# Altium schematic symbol library BARKO_SCHLIB.SchLib: 1064 symbols (part 9 of 11) (continued)
## R-0R-0402 3 Pad (continued)
RES SMD 0 OHM JUMPER 1/16W 0402; Manufacturer: Royal Electronic Factory; Manufacturer Part Number: 0402WGJ0000TCE; Resistance: 0mR; Max Power Dissipation: 63mW; Power Rating: 62.5mW; Tolerance: 5%; Voltage Rating: 50V; Temperature Coefficient: 200ppm/°C; .PCBCHK: USED; .Creator: F:TALI; Washability: OK; ComponentLink1URL: http://www.vishay.com/docs/20035/dcrcwe3.pdf; ComponentLink1Description: http://www.vishay.com/docs/20035/dcrcwe3.pdf; ComponentLink2URL: http://www.farnell.com/datasheets/2111203.pdf; ComponentLink2Description: http://www.farnell.com/datasheets/2111203.pdf; ComponentLink3URL: http://www.farnell.com/datasheets/2045673.pdf; ComponentLink3Description: http://www.farnell.com/datasheets/2045673.pdf; ComponentLink4URL: https://www.distrelec.biz/Web/Downloads/a_/en/flD-CRCW-e3_data_en.pdf?mime=application%2Fpdf; ComponentLink4Description: https://www.distrelec.biz/Web/Downloads/a_/en/flD-CRCW-e3_data_en.pdf?mime=application%2Fpdf; ComponentLink5URL: http://datasheet.octopart.com/CRCW04020000Z0ED-Vishay-datasheet-14722531.pdf; ComponentLink5Description: http://datasheet.octopart.com/CRCW04020000Z0ED-Vishay-datasheet-14722531.pdf; ComponentLink6URL: http://datasheet.octopart.com/CRCW04020000Z0ED-Vishay-datasheet-83961561.pdf; ComponentLink6Description: http://datasheet.octopart.com/CRCW04020000Z0ED-Vishay-datasheet-83961561.pdf; ComponentLink7URL: http://datasheet.octopart.com/CRCW04020000Z0ED-Vishay-datasheet-16179825.pdf; ComponentLink7Description: http://datasheet.octopart.com/CRCW04020000Z0ED-Vishay-datasheet-16179825.pdf; ComponentLink8URL: http://datasheet.octopart.com/CRCW04020000Z0ED-Vishay-datasheet-62317933.pdf; ComponentLink8Description: http://datasheet.octopart.com/CRCW04020000Z0ED-Vishay-datasheet-62317933.pdf; ComponentLink9URL: http://datasheet.octopart.com/CRCW04020000Z0ED-Vishay-datasheet-5300368.pdf; ComponentLink9Description: http://datasheet.octopart.com/CRCW04020000Z0ED-Vishay-datasheet-5300368.pdf; ComponentLink10URL: http://datasheet.octopart.com/CRCW04020000Z0ED-Vishay-datasheet-5306405.pdf; ComponentLink10Description: http://datasheet.octopart.com/CRCW04020000Z0ED-Vishay-datasheet-5306405.pdf; ComponentLink11URL: http://datasheet.octopart.com/CRCW04020000Z0ED-Vishay-datasheet-11516975.pdf; ComponentLink11Description: http://datasheet.octopart.com/CRCW04020000Z0ED-Vishay-datasheet-11516975.pdf; ComponentLink12URL: http://datasheet.octopart.com/CRCW04020000Z0ED-Vishay-datasheet-17599201.pdf; ComponentLink12Description: http://datasheet.octopart.com/CRCW04020000Z0ED-Vishay-datasheet-17599201.pdf; ComponentLink13URL: http://datasheet.octopart.com/CRCW04020000Z0ED-Vishay-datasheet-41302739.pdf; ComponentLink13Description: http://datasheet.octopart.com/CRCW04020000Z0ED-Vishay-datasheet-41302739.pdf; ComponentLink14URL: http://datasheet.octopart.com/CRCW04020000Z0ED-Vishay-datasheet-27121962.pdf; ComponentLink14Description: http://datasheet.octopart.com/CRCW04020000Z0ED-Vishay-datasheet-27121962.pdf; ComponentLink15URL: http://datasheet.octopart.com/CRCW04020000Z0ED-Vishay-datasheet-66077789.pdf; ComponentLink15Description: http://datasheet.octopart.com/CRCW04020000Z0ED-Vishay-datasheet-66077789.pdf; ComponentLink16URL: http://datasheet.octopart.com/CRCW04020000Z0ED-Vishay-datasheet-42367.pdf; ComponentLink16Description: http://datasheet.octopart.com/CRCW04020000Z0ED-Vishay-datasheet-42367.pdf; ComponentLink17URL: http://datasheet.octopart.com/CRCW04020000Z0ED-Vishay-datasheet-148188.pdf; ComponentLink17Description: http://datasheet.octopart.com/CRCW04020000Z0ED-Vishay-datasheet-148188.pdf; ComponentLink18URL: http://datasheet.octopart.com/CRCW04020000Z0ED-Vishay-datasheet-5377255.pdf; ComponentLink18Description: http://datasheet.octopart.com/CRCW04020000Z0ED-Vishay-datasheet-5377255.pdf; ComponentLink19URL: http://datasheet.octopart.com/CRCW04020000Z0ED-Vishay-datasheet-8619608.pdf; ComponentLink19Description: http://datasheet.octopart.com/CRCW04020000Z0ED-Vishay-datasheet-8619608.pdf; ComponentLink20URL: http://datasheet.octopart.com/CRCW04020000Z0ED-Vishay-datasheet-11540273.pdf; ComponentLink20Description: http://datasheet.octopart.com/CRCW04020000Z0ED-Vishay-datasheet-11540273.pdf; ComponentLink21URL: http://datasheet.octopart.com/CRCW04020000Z0ED-Vishay-datasheet-12001583.pdf; ComponentLink21Description: http://datasheet.octopart.com/CRCW04020000Z0ED-Vishay-datasheet-12001583.pdf; ComponentLink22URL: http://datasheet.octopart.com/CRCW04020000Z0ED-Vishay-datasheet-546287.pdf; ComponentLink22Description: http://datasheet.octopart.com/CRCW04020000Z0ED-Vishay-datasheet-546287.pdf; ComponentLink23URL: http://datasheet.octopart.com/CRCW04020000Z0ED-Vishay-datasheet-8361388.pdf; ComponentLink23Description: http://datasheet.octopart.com/CRCW04020000Z0ED-Vishay-datasheet-8361388.pdf; ComponentLink24URL: http://datasheet.octopart.com/CRCW04020000Z0ED-Vishay-datasheet-8788789.pdf; ComponentLink24Description: http://datasheet.octopart.com/CRCW04020000Z0ED-Vishay-datasheet-8788789.pdf; ComponentLink25URL: http://datasheet.octopart.com/CRCW04020000Z0ED-Vishay-datasheet-10322335.pdf; ComponentLink25Description: http://datasheet.octopart.com/CRCW04020000Z0ED-Vishay-datasheet-10322335.pdf; ComponentLink26URL: http://datasheet.octopart.com/CRCW04020000Z0ED-Vishay-datasheet-12509762.pdf; ComponentLink26Description: http://datasheet.octopart.com/CRCW04020000Z0ED-Vishay-datasheet-12509762.pdf; ComponentLink27URL: http://datasheet.octopart.com/CRCW04020000Z0ED-Vishay-datasheet-12517896.pdf; ComponentLink27Description: http://datasheet.octopart.com/CRCW04020000Z0ED-Vishay-datasheet-12517896.pdf; ComponentLink28URL: http://datasheet.octopart.com/CRCW04020000Z0ED-Vishay-datasheet-12532161.pdf; ComponentLink28Description: http://datasheet.octopart.com/CRCW04020000Z0ED-Vishay-datasheet-12532161.pdf; ComponentLink29URL: http://datasheet.octopart.com/CRCW04020000Z0ED-Vishay-datasheet-12600034.pdf; ComponentLink29Description: http://datasheet.octopart.com/CRCW04020000Z0ED-Vishay-datasheet-12600034.pdf; ComponentLink30URL: http://datasheet.octopart.com/CRCW04020000Z0ED-Vishay-datasheet-13034211.pdf; ComponentLink30Description: http://datasheet.octopart.com/CRCW04020000Z0ED-Vishay-datasheet-13034211.pdf; ComponentLink31URL: http://datasheet.octopart.com/CRCW04020000Z0ED-Vishay-datasheet-13195083.pdf; ComponentLink31Description: http://datasheet.octopart.com/CRCW04020000Z0ED-Vishay-datasheet-13195083.pdf; ComponentLink32URL: http://datasheet.octopart.com/CRCW04020000Z0ED-Vishay-datasheet-13242068.pdf; ComponentLink32Description: http://datasheet.octopart.com/CRCW04020000Z0ED-Vishay-datasheet-13242068.pdf; ComponentLink33URL: http://datasheet.octopart.com/CRCW04020000Z0ED-Vishay-datasheet-14190200.pdf; ComponentLink33Description: http://datasheet.octopart.com/CRCW04020000Z0ED-Vishay-datasheet-14190200.pdf; ComponentLink34URL: http://datasheet.octopart.com/CRCW04020000Z0ED-Vishay-Dale-datasheet-38056517.pdf; ComponentLink34Description: http://datasheet.octopart.com/CRCW04020000Z0ED-Vishay-Dale-datasheet-38056517.pdf; ComponentLink35URL: http://datasheet.octopart.com/CRCW04020000Z0ED-Vishay-Dale-datasheet-47688880.pdf; ComponentLink35Description: http://datasheet.octopart.com/CRCW04020000Z0ED-Vishay-Dale-datasheet-47688880.pdf; ComponentLink36URL: http://datasheet.octopart.com/D-CRCW-e3-Standard-Thick-Film-Chip-Resistors-Vishay-datasheet-family-64.pdf; ComponentLink36Description: http://datasheet.octopart.com/D-CRCW-e3-Standard-Thick-Film-Chip-Resistors-Vishay-datasheet-family-64.pdf; Stock 1: 3532500; Pricing 1: 100=0.0089, 1000=0.0025, 10000=0.0013, 50000=0.00115, 250000=0.00105 (USD); Stock 2: 29923308; Pricing 2: 1=0.1, 10=0.014, 25=0.01, 50=0.0078, 100=0.0057, 250=0.00436, 500=0.00348, 1000=0.00257, 5000=0.00184 (USD); Case/Package: 0402; Case Code (Metric): 1005; Contact Plating: Matte,Tin; Min Operating Temperature: -55°C; Max Operating Temperature: 155°C; Packaging: Tape and Reel; Composition: Thick Film; Package Quantity: 1; Number of Terminations: 2; Termination: SMD/SMT; Features: Moisture Resistant; Military Standard: Not; Length: 1mm; Height: 0.016inch; Width: 0.02inch; Depth: 0.5mm; Radiation Hardening: No; Lead Free: Lead Free; REACH SVHC: Unknown; ComponentLink37URL: http://www.yageo.com/documents/recent/PYu-RC_Group_51_RoHS_L_9.pdf; ComponentLink37Description: http://www.yageo.com/documents/recent/PYu-RC_Group_51_RoHS_L_9.pdf; ComponentLink38URL: http://www.yageo.com/documents/recent/PYu-RC0402_51_RoHS_L_6.pdf; ComponentLink38Description: http://www.yageo.com/documents/recent/PYu-RC0402_51_RoHS_L_6.pdf; ComponentLink39URL: http://www.farnell.com/datasheets/1018594.pdf; ComponentLink39Description: http://www.farnell.com/datasheets/1018594.pdf; ComponentLink40URL: https://www.verical.com/server-webapp/html/getDatasheet?partID=326379; ComponentLink40Description: https://www.verical.com/server-webapp/html/getDatasheet?partID=326379; ComponentLink41URL: http://www.farnell.com/datasheets/2167052.pdf; ComponentLink41Description: http://www.farnell.com/datasheets/2167052.pdf; Mount: Surface Mount; Weight: 2.3E-05oz; Voltage Rating (DC): 50V; Stock 3: 70631880; Pricing 3: 1=0.1, 10=0.03, 25=0.0216, 50=0.0164, 100=0.0121, 250=0.00924, 500=0.0074, 1000=0.00545, 5000=0.00391 (USD); ComponentLink42URL: http://industrial.panasonic.com/www-data/pdf/AOA0000/AOA0000CE1.pdf; ComponentLink42Description: http://industrial.panasonic.com/www-data/pdf/AOA0000/AOA0000CE1.pdf; ComponentLink43URL: http://www.alliedelec.com/m/d/51cd0790071e1666bdb9d00c57fcf960.pdf; ComponentLink43Description: http://www.alliedelec.com/m/d/51cd0790071e1666bdb9d00c57fcf960.pdf; ComponentLink44URL: http://www.farnell.com/datasheets/2059623.pdf; ComponentLink44Description: http://www.farnell.com/datasheets/2059623.pdf; ComponentLink45URL: http://www.farnell.com/datasheets/1678796.pdf; ComponentLink45Description: http://www.farnell.com/datasheets/1678796.pdf; .SCHCHK: USED; Supplier 1: Digi-Key; Supplier Part Number 1: 311-0.0JRDKR-ND
footprint R-0402 - 3 Pad
pins: 1, 2, 3

## R-0R-0603
designator R?, comment 0R  Case Code (Imperial): 0603
RES SMD 0 OHM 1/10W JUMP 0603; Manufacturer: Yageo; Manufacturer Part Number: RC0603JR-070RL; Resistance: 0mR; Tolerance: 1%; Power Rating: 100mW; Voltage Rating (DC): 50V; Temperature Coefficient: 200ppm/°C; Current Rating: 1A; Working Voltage: 75V; .PCBCHK: USED; .Creator: F:TALI; Washability: OK; Stock 1: 54397731; Pricing 1: 1=0.1, 10=0.021, 25=0.0152, 50=0.0114, 100=0.0084, 250=0.00644, 500=0.00514, 1000=0.00379 (USD); Case/Package: 0603; Number of Pins: 2; Contact Plating: Matte,Tin; Case Code (Metric): 1608; Min Operating Temperature: -55°C; Max Operating Temperature: 155°C; Composition: Thick Film; Packaging: Tape and Reel; Termination: SMD/SMT; Package Quantity: 5000; Voltage Rating: 50V; Military Standard: Not; Length: 1.6mm; Height: 0.45mm; Width: 0.8mm; Depth: 0.8mm; Radiation Hardening: No; REACH SVHC: No SVHC; Lead Free: Lead Free; ComponentLink1URL: http://www.farnell.com/datasheets/1738695.pdf; ComponentLink1Description: http://www.farnell.com/datasheets/1738695.pdf; ComponentLink2URL: https://www.verical.com/server-webapp/html/getDatasheet?partID=329462; ComponentLink2Description: https://www.verical.com/server-webapp/html/getDatasheet?partID=329462; ComponentLink3URL: http://www.yageo.com/documents/recent/PYu-RC_Group_51_RoHS_L_9.pdf; ComponentLink3Description: http://www.yageo.com/documents/recent/PYu-RC_Group_51_RoHS_L_9.pdf; ComponentLink4URL: http://www.farnell.com/datasheets/443971.pdf; ComponentLink4Description: http://www.farnell.com/datasheets/443971.pdf; ComponentLink5URL: http://documents.rs-components.com/techlib://itc_doclist_GB.htm?stockno=6515918; ComponentLink5Description: http://documents.rs-components.com/techlib://itc_doclist_GB.htm?stockno=6515918; Stock 2: 6104331; Pricing 2: 1=0.1, 10=0.021, 25=0.0152, 50=0.0114, 100=0.0084, 250=0.00644, 500=0.00514, 1000=0.00379 (USD); Number of Terminations: 2; Max Power Dissipation: 100mW; Features: Moisture Resistant; ComponentLink6URL: http://www.farnell.com/datasheets/1868787.pdf; ComponentLink6Description: http://www.farnell.com/datasheets/1868787.pdf; ComponentLink7URL: http://documents.rs-components.com/techlib://itc_doclist_GB.htm?stockno=5048827; ComponentLink7Description: http://documents.rs-components.com/techlib://itc_doclist_GB.htm?stockno=5048827; Stock 3: 34178498; Pricing 3: 1=0.1, 10=0.042, 25=0.0304, 50=0.0232, 100=0.0171, 250=0.01308, 500=0.01046, 1000=0.0077 (USD); Mount: Surface Mount; ComponentLink8URL: http://industrial.panasonic.com/www-data/pdf/AOA0000/AOA0000CE1.pdf; ComponentLink8Description: http://industrial.panasonic.com/www-data/pdf/AOA0000/AOA0000CE1.pdf; ComponentLink9URL: http://www.farnell.com/datasheets/2059623.pdf; ComponentLink9Description: http://www.farnell.com/datasheets/2059623.pdf; ComponentLink10URL: http://www.jameco.com/Jameco/Products/ProdDS/1935748.pdf; ComponentLink10Description: http://www.jameco.com/Jameco/Products/ProdDS/1935748.pdf; ComponentLink11URL: http://www.farnell.com/datasheets/1678796.pdf; ComponentLink11Description: http://www.farnell.com/datasheets/1678796.pdf; ComponentLink12URL: http://www.alliedelec.com/m/d/51cd0790071e1666bdb9d00c57fcf960.pdf; ComponentLink12Description: http://www.alliedelec.com/m/d/51cd0790071e1666bdb9d00c57fcf960.pdf; .SCHCHK: USED; Supplier 1: Digi-Key; Supplier Part Number 1: 311-0.0HRDKR-ND
footprint JMP-0603
pins: 1, 2

## R-0R-0603 3 Pad
designator R?, comment 0R  Case Code (Imperial): 0603
RES SMD 0 OHM 1/10W JUMP 0603; Manufacturer: Yageo; Manufacturer Part Number: RC0603JR-070RL; Resistance: 0mR; Tolerance: 1%; Power Rating: 100mW; Voltage Rating (DC): 50V; Temperature Coefficient: 200ppm/°C; Current Rating: 1A; Working Voltage: 75V; .PCBCHK: USED; .Creator: F:TALI; Washability: OK; Stock 1: 54397731; Pricing 1: 1=0.1, 10=0.021, 25=0.0152, 50=0.0114, 100=0.0084, 250=0.00644, 500=0.00514, 1000=0.00379 (USD); Case/Package: 0603; Number of Pins: 2; Contact Plating: Matte,Tin; Case Code (Metric): 1608; Min Operating Temperature: -55°C; Max Operating Temperature: 155°C; Composition: Thick Film; Packaging: Tape and Reel; Termination: SMD/SMT; Package Quantity: 5000; Voltage Rating: 50V; Military Standard: Not; Length: 1.6mm; Height: 0.45mm; Width: 0.8mm; Depth: 0.8mm; Radiation Hardening: No; REACH SVHC: No SVHC; Lead Free: Lead Free; ComponentLink1URL: http://www.farnell.com/datasheets/1738695.pdf; ComponentLink1Description: http://www.farnell.com/datasheets/1738695.pdf; ComponentLink2URL: https://www.verical.com/server-webapp/html/getDatasheet?partID=329462; ComponentLink2Description: https://www.verical.com/server-webapp/html/getDatasheet?partID=329462; ComponentLink3URL: http://www.yageo.com/documents/recent/PYu-RC_Group_51_RoHS_L_9.pdf; ComponentLink3Description: http://www.yageo.com/documents/recent/PYu-RC_Group_51_RoHS_L_9.pdf; ComponentLink4URL: http://www.farnell.com/datasheets/443971.pdf; ComponentLink4Description: http://www.farnell.com/datasheets/443971.pdf; ComponentLink5URL: http://documents.rs-components.com/techlib://itc_doclist_GB.htm?stockno=6515918; ComponentLink5Description: http://documents.rs-components.com/techlib://itc_doclist_GB.htm?stockno=6515918; Stock 2: 6104331; Pricing 2: 1=0.1, 10=0.021, 25=0.0152, 50=0.0114, 100=0.0084, 250=0.00644, 500=0.00514, 1000=0.00379 (USD); Number of Terminations: 2; Max Power Dissipation: 100mW; Features: Moisture Resistant; ComponentLink6URL: http://www.farnell.com/datasheets/1868787.pdf; ComponentLink6Description: http://www.farnell.com/datasheets/1868787.pdf; ComponentLink7URL: http://documents.rs-components.com/techlib://itc_doclist_GB.htm?stockno=5048827; ComponentLink7Description: http://documents.rs-components.com/techlib://itc_doclist_GB.htm?stockno=5048827; Stock 3: 34178498; Pricing 3: 1=0.1, 10=0.042, 25=0.0304, 50=0.0232, 100=0.0171, 250=0.01308, 500=0.01046, 1000=0.0077 (USD); Mount: Surface Mount; ComponentLink8URL: http://industrial.panasonic.com/www-data/pdf/AOA0000/AOA0000CE1.pdf; ComponentLink8Description: http://industrial.panasonic.com/www-data/pdf/AOA0000/AOA0000CE1.pdf; ComponentLink9URL: http://www.farnell.com/datasheets/2059623.pdf; ComponentLink9Description: http://www.farnell.com/datasheets/2059623.pdf; ComponentLink10URL: http://www.jameco.com/Jameco/Products/ProdDS/1935748.pdf; ComponentLink10Description: http://www.jameco.com/Jameco/Products/ProdDS/1935748.pdf; ComponentLink11URL: http://www.farnell.com/datasheets/1678796.pdf; ComponentLink11Description: http://www.farnell.com/datasheets/1678796.pdf; ComponentLink12URL: http://www.alliedelec.com/m/d/51cd0790071e1666bdb9d00c57fcf960.pdf; ComponentLink12Description: http://www.alliedelec.com/m/d/51cd0790071e1666bdb9d00c57fcf960.pdf; .SCHCHK: USED; Supplier 1: Digi-Key; Supplier Part Number 1: 311-0.0HRDKR-ND
footprint R-0603 - 3 Pad
pins: 1, 2, 3

## R-0R-0804
designator R?, comment 0R
RES ARRAY 4 RES ZERO OHM 0804; Manufacturer: Stackpole Electronics; Manufacturer Part Number: RAVF104DZT0R00; Number of Terminals/Pins: 8; Resistance: 0mR; Circuit Type: Isolated; Number of Resistors: 4; Power Per Element: 62.5mW; Power Rating: 63mW; Supplier 1: Digi-Key; RoHS: Yes; Category: Resistor Arrays; Stock 1: 5668; Pricing 1: 1=0.10000, 10=0.05800, 25=0.04200, 50=0.03200, 100=0.02360, 250=0.01800, 500=0.01440, 1000=0.01060, 5000=0.00760 (USD); Mount: Surface Mount; Case/Package: SMD/SMT; Number of Pins: 8; Min Operating Temperature: -55°C; Max Operating Temperature: 155°C; Package Quantity: 1; Packaging: Tape and Reel; Length: 0.079inch; Width: 0.039inch; Height: 0.02inch; Radiation Hardening: No; Lead Free: Lead Free; ComponentLink1URL: https://www.seielect.com/catalog/SEI-Packaging.pdf?src-supplier=Digi-Key; ComponentLink1Description: https://www.seielect.com/catalog/SEI-Packaging.pdf?src-supplier=Digi-Key; ComponentLink2URL: http://www.seielect.com/Catalog/SEI-RAVF.pdf?src-supplier=Future+Electronics; ComponentLink2Description: http://www.seielect.com/Catalog/SEI-RAVF.pdf?src-supplier=Future+Electronics; Supplier Part Number 1: RAVF104DZT0R00CT-ND
footprint R-0804 (SMD, 8-Leads, Body 2x1mm, Pitch 0.5mm)
pins: 1, 2, 3, 4, 5, 6, 7, 8

## R-0R-0805
designator R?, comment 0R  Case Code (Imperial): 0805
RES SMD 0 OHM JUMPER 1/8W 0805; Manufacturer: Yageo; Manufacturer Part Number: RC0805JR-070RL; Resistance: 0mR; Tolerance: 5%; Power Rating: 125mW; Voltage Rating: 150V; Temperature Coefficient: 200ppm/°C; Max Power Dissipation: 100mW; Current Rating: 1A; Working Voltage: 75V; .PCBCHK: USED; .Creator: F:TALI; Washability: OK; Stock 1: 0; Pricing 1: 1=0.1, 10=0.037, 25=0.0272, 50=0.0206, 100=0.0153, 250=0.01164, 500=0.0093, 1000=0.00685 (USD); Case/Package: 0805; Number of Pins: 2; Contact Plating: Matte,Tin; Case Code (Metric): 2012; Min Operating Temperature: -55°C; Max Operating Temperature: 155°C; Composition: Thick Film; Packaging: Tape and Reel; Voltage Rating (DC): 150V; Termination: SMD/SMT; Military Standard: Not; Length: 2mm; Height: 0.5mm; Width: 1.25mm; Depth: 1.25mm; Radiation Hardening: No; REACH SVHC: Unknown; Lead Free: Lead Free; ComponentLink1URL: http://www.farnell.com/datasheets/1738694.pdf; ComponentLink1Description: http://www.farnell.com/datasheets/1738694.pdf; ComponentLink2URL: http://documents.rs-components.com/techlib://itc_doclist_GB.htm?stockno=6185129; ComponentLink2Description: http://documents.rs-components.com/techlib://itc_doclist_GB.htm?stockno=6185129; ComponentLink3URL: https://www.verical.com/server-webapp/html/getDatasheet?partID=330685; ComponentLink3Description: https://www.verical.com/server-webapp/html/getDatasheet?partID=330685; Stock 2: 10294500; Pricing 2: 100=0.0199, 1000=0.0089, 5000=0.0043, 15000=0.0036, 50000=0.0032 (USD); Package Quantity: 5000; Number of Terminations: 2; Features: Moisture Resistant; ComponentLink4URL: http://www.farnell.com/datasheets/1868787.pdf; ComponentLink4Description: http://www.farnell.com/datasheets/1868787.pdf; ComponentLink5URL: http://www.farnell.com/datasheets/443971.pdf; ComponentLink5Description: http://www.farnell.com/datasheets/443971.pdf; ComponentLink6URL: http://www.yageo.com/documents/recent/PYu-RC_Group_51_RoHS_L_9.pdf; ComponentLink6Description: http://www.yageo.com/documents/recent/PYu-RC_Group_51_RoHS_L_9.pdf; ComponentLink7URL: http://documents.rs-components.com/techlib://itc_doclist_GB.htm?stockno=5048827; ComponentLink7Description: http://documents.rs-components.com/techlib://itc_doclist_GB.htm?stockno=5048827; Stock 3: 3725312; Pricing 3: 1=0.1, 10=0.06, 25=0.0432, 50=0.033, 100=0.0243, 250=0.01852, 500=0.01482, 1000=0.0109 (USD); Mount: Surface Mount; ComponentLink8URL: http://www.farnell.com/datasheets/1678796.pdf; ComponentLink8Description: http://www.farnell.com/datasheets/1678796.pdf; ComponentLink9URL: http://www.farnell.com/datasheets/2371628.pdf; ComponentLink9Description: http://www.farnell.com/datasheets/2371628.pdf; ComponentLink10URL: http://industrial.panasonic.com/www-data/pdf/AOA0000/AOA0000CE1.pdf; ComponentLink10Description: http://industrial.panasonic.com/www-data/pdf/AOA0000/AOA0000CE1.pdf; ComponentLink11URL: http://industrial.panasonic.com/www-cgi/jvcr13pz.cgi?E+PZ+3+AOA0001+ERJ6GEY0R00V+7+WW; ComponentLink11Description: http://industrial.panasonic.com/www-cgi/jvcr13pz.cgi?E+PZ+3+AOA0001+ERJ6GEY0R00V+7+WW; .SCHCHK: USED; Supplier 1: Digi-Key; Supplier Part Number 1: 311-0.0ARDKR-ND
footprint JMP-0805
footprint R-0805
pins: 1, 2

## R-0R-1206
designator R?, comment 0R  Max Power Dissipation: 1/4W  Case Code (Imperial): 1206
RES SMD 0 OHM JUMPER 1/4W 1206; Manufacturer: Panasonic; Manufacturer Part Number: ERJ-8GEY0R00V; Resistance: 0mR; Power Rating: 250mW; Voltage Rating: 200V; Tolerance: 0.05%; Temperature Coefficient: 600ppm/°C; .PCBCHK: USED; .Creator: F:TALI; Washability: OK; Stock 1: 1595136; Pricing 1: 1=0.1, 10=0.072, 25=0.052, 50=0.0396, 100=0.0293, 250=0.02232, 500=0.01786, 1000=0.01315 (USD); Mount: Surface Mount; Case/Package: 1206; Contact Plating: Tin; Case Code (Metric): 3216; Min Operating Temperature: -55°C; Max Operating Temperature: 155°C; Composition: Thick Film; Packaging: Tape and Reel; Military Standard: Not; Voltage Rating (DC): 200V; Package Quantity: 1; Number of Terminations: 2; Termination: SMD/SMT; Features: Automotive AEC-Q200; Length: 3.2mm; Height: 0.028inch; Width: 0.063inch; Depth: 1.6mm; Radiation Hardening: No; REACH SVHC: No SVHC; Lead Free: Lead Free; ComponentLink1URL: http://www.farnell.com/datasheets/1678796.pdf; ComponentLink1Description: http://www.farnell.com/datasheets/1678796.pdf; ComponentLink2URL: http://www.jameco.com/Jameco/Products/ProdDS/1990261.pdf; ComponentLink2Description: http://www.jameco.com/Jameco/Products/ProdDS/1990261.pdf; ComponentLink3URL: http://industrial.panasonic.com/www-data/pdf/AOA0000/AOA0000CE1.pdf; ComponentLink3Description: http://industrial.panasonic.com/www-data/pdf/AOA0000/AOA0000CE1.pdf; Stock 2: 31630522; Pricing 2: 1=0.1, 10=0.067, 25=0.0484, 50=0.0368, 100=0.0271, 250=0.02068, 500=0.01656, 1000=0.01218 (USD); ComponentLink4URL: http://www.farnell.com/datasheets/1692832.pdf; ComponentLink4Description: http://www.farnell.com/datasheets/1692832.pdf; ComponentLink5URL: http://www.farnell.com/datasheets/444357.pdf; ComponentLink5Description: http://www.farnell.com/datasheets/444357.pdf; ComponentLink6URL: http://www.yageo.com/documents/recent/PYu-RC1206_51_RoHS_L-4.pdf; ComponentLink6Description: http://www.yageo.com/documents/recent/PYu-RC1206_51_RoHS_L-4.pdf; ComponentLink7URL: http://www.yageo.com/documents/recent/PYu-RC_Group_51_RoHS_L_9.pdf; ComponentLink7Description: http://www.yageo.com/documents/recent/PYu-RC_Group_51_RoHS_L_9.pdf; ComponentLink8URL: http://documents.rs-components.com/techlib://itc_doclist_GB.htm?stockno=6182243; ComponentLink8Description: http://documents.rs-components.com/techlib://itc_doclist_GB.htm?stockno=6182243; ComponentLink9URL: http://www.produktinfo.conrad.com/datenblaetter/400000-424999/402222-da-01-en-SMD_WIDERSTAND_0_OHM_1206.pdf; ComponentLink9Description: http://www.produktinfo.conrad.com/datenblaetter/400000-424999/402222-da-01-en-SMD_WIDERSTAND_0_OHM_1206.pdf; Stock 3: 1015881; Pricing 3: 1=0.1, 10=0.08, 25=0.0576, 50=0.044, 100=0.0324, 250=0.02472, 500=0.01976, 1000=0.01455 (USD); Weight: 0.000353oz; ComponentLink10URL: http://www.alliedelec.com/m/d/0c934d6939ccefa68dbe0b96d821c8cf.pdf; ComponentLink10Description: http://www.alliedelec.com/m/d/0c934d6939ccefa68dbe0b96d821c8cf.pdf; ComponentLink11URL: http://www.farnell.com/datasheets/2111203.pdf; ComponentLink11Description: http://www.farnell.com/datasheets/2111203.pdf; ComponentLink12URL: http://www.vishay.com/docs/20035/dcrcwe3.pdf; ComponentLink12Description: http://www.vishay.com/docs/20035/dcrcwe3.pdf; ComponentLink13URL: http://www.mouser.com/ds/2/427/dcrcwe3-109170.pdf; ComponentLink13Description: http://www.mouser.com/ds/2/427/dcrcwe3-109170.pdf; ComponentLink14URL: http://www.farnell.com/datasheets/2046716.pdf; ComponentLink14Description: http://www.farnell.com/datasheets/2046716.pdf; ComponentLink15URL: http://uk.rs-online.com/webdocs/0d98/0900766b80d98b5e.pdf; ComponentLink15Description: http://uk.rs-online.com/webdocs/0d98/0900766b80d98b5e.pdf; .SCHCHK: USED; Supplier 1: Digi-Key; Supplier Part Number 1: P0.0ECT-ND; Supplier 2: Digi-Key; Supplier Part Number 2: 311-0.0ERDKR-ND
footprint JMP-1206
pins: 1, 2

## R-0R-1206 Array
designator R?, comment 0R
RES ARRAY 4 RES ZERO OHM 1206; Manufacturer: Stackpole Electronics; Manufacturer Part Number: RAVF164DZT0R00; Number of Terminals/Pins: 8; Temperature Coefficient: 200ppm/°C; Resistance: 0mR; Circuit Type: Isolated; Number of Resistors: 4; Power Per Element: 62.5mW; Power Rating: 250mW; Supplier 1: Digi-Key; RoHS: Yes; Category: Resistor Arrays; Stock 1: 3810; Pricing 1: 1=0.10000, 10=0.04400, 25=0.03160, 50=0.02400, 100=0.01770, 250=0.01352, 500=0.01080, 1000=0.00795 (USD); Mount: Surface Mount; Case/Package: SMD/SMT; Number of Pins: 8; Case Code (Imperial): 1206; Case Code (Metric): 3216; Min Operating Temperature: -55°C; Max Operating Temperature: 155°C; Package Quantity: 1; Packaging: Tape and Reel; Termination: Convex; Length: 0.126inch; Width: 0.063inch; Height: 0.024inch; Depth: 1.6mm; Terminal Pitch: 0.8mm; Radiation Hardening: No; Lead Free: Lead Free; Military Standard: Not; ComponentLink1URL: https://datasheet.ciiva.com/26919/getdatasheetpartid-565527-26919518.pdf?src-supplier=Verical; ComponentLink1Description: https://datasheet.ciiva.com/26919/getdatasheetpartid-565527-26919518.pdf?src-supplier=Verical; Supplier Part Number 1: RAVF164DZT0R00CT-ND
footprint R-1206-ARRAY (SMD, 8-Leads, Body 1.6x3.2mm, Pitch 0.8mm)
pins: 1, 2, 3, 4, 5, 6, 7, 8

## R-0R-1210
designator R?, comment 0R  Max Power Dissipation: 1/2W  Case Code (Imperial): 1210
RES SMD 0 OHM JUMP 1/2W 1210; Manufacturer: Yageo; Manufacturer Part Number: RC1210JR-070RL; Resistance: 0mR; Tolerance: 5%; Power Rating: 500mW; Voltage Rating: 200V; Temperature Coefficient: 200ppm/°C; .PCBCHK: USED; .Creator: F:TALI; Washability: OK; Stock 1: 1132529; Pricing 1: 1=0.15, 10=0.127, 25=0.092, 50=0.0668, 100=0.0495, 250=0.03796, 500=0.02992, 1000=0.02071 (USD); Mount: Surface Mount; Case/Package: 1210; Contact Plating: Matte,Tin; Case Code (Metric): 3225; Min Operating Temperature: -55°C; Max Operating Temperature: 155°C; Composition: Thick Film; Packaging: Tape and Reel; Package Quantity: 5000; Number of Terminations: 2; Termination: SMD/SMT; Military Standard: Not; Features: Moisture Resistant; Length: 3.1mm; Height: 0.5mm; Width: 0.102inch; Depth: 2.6mm; Radiation Hardening: No; Lead Free: Lead Free; ComponentLink1URL: http://www.yageo.com/documents/recent/PYu-RC1210_51_RoHS_L_(4).pdf; ComponentLink1Description: http://www.yageo.com/documents/recent/PYu-RC1210_51_RoHS_L_(4).pdf; Stock 2: 1276523; Pricing 2: 1=0.12, 10=0.11, 25=0.0764, 50=0.0592, 100=0.0424, 250=0.03304, 500=0.02626, 1000=0.01863 (USD); .SCHCHK: USED; Supplier 1: Digi-Key; Supplier Part Number 1: YAG3375DKR-ND
footprint JMP-1210
pins: 1, 2

## R-0R-2512
designator R?, comment 0R  Power Rating: 1W  Case Code (Imperial): 2512
RES SMD 0 OHM JUMPER 1W 2512; Manufacturer: Yageo; Manufacturer Part Number: RC2512JK-070RL; Resistance: 0mR; Tolerance: 5%; Voltage Rating: 200V; Temperature Coefficient: 200ppm/°C; .PCBCHK: USED; .Creator: F:TALI; Washability: OK; Case/Package: 2512; Contact Plating: Matte,Tin; Case Code (Metric): 6432; Min Operating Temperature: -55°C; Max Operating Temperature: 155°C; Packaging: Tape and Reel; Package Quantity: 4000; Composition: Thick Film; Termination: SMD/SMT; Number of Terminations: 2; Max Power Dissipation: 1W; Features: Moisture Resistant; Length: 0.25inch; Height: 0.026inch; Width: 3.1mm; Radiation Hardening: No; REACH SVHC: Unknown; Lead Free: Lead Free; ComponentLink1URL: http://www.yageo.com/documents/recent/PYu-RC2512_51_RoHS_L_(4).pdf; ComponentLink1Description: http://www.yageo.com/documents/recent/PYu-RC2512_51_RoHS_L_(4).pdf; ComponentLink2URL: http://www.farnell.com/datasheets/1699814.pdf; ComponentLink2Description: http://www.farnell.com/datasheets/1699814.pdf; Stock 1: 1020107; Pricing 1: 1=0.39, 10=0.333, 25=0.242, 50=0.1754, 100=0.1301, 250=0.09984, 500=0.07866, 1000=0.05445 (USD); Mount: Surface Mount; Number of Pins: 2; Weight: 0.001429oz; Military Standard: Not; Depth: 3.15mm; ComponentLink3URL: http://www.vishay.com/docs/20035/dcrcwe3.pdf; ComponentLink3Description: http://www.vishay.com/docs/20035/dcrcwe3.pdf; ComponentLink4URL: http://www.alliedelec.com/m/d/0c934d6939ccefa68dbe0b96d821c8cf.pdf; ComponentLink4Description: http://www.alliedelec.com/m/d/0c934d6939ccefa68dbe0b96d821c8cf.pdf; ComponentLink5URL: http://www.farnell.com/datasheets/2045673.pdf; ComponentLink5Description: http://www.farnell.com/datasheets/2045673.pdf; ComponentLink6URL: http://www.mouser.com/ds/2/427/dcrcwe3-109170.pdf; ComponentLink6Description: http://www.mouser.com/ds/2/427/dcrcwe3-109170.pdf; Stock 2: 228938; Pricing 2: 1=0.31, 10=0.266, 25=0.1936, 50=0.1404, 100=0.1041, 250=0.07988, 500=0.06292, 1000=0.04356 (USD); Stock 3: 31479; Pricing 3: 1=0.23, 10=0.191, 25=0.1388, 50=0.1004, 100=0.0745, 250=0.05716, 500=0.04504, 1000=0.03119 (USD); Voltage Rating (DC): 200V; ComponentLink7URL: http://www.bourns.com/data/global/pdfs/cr2010.pdf; ComponentLink7Description: http://www.bourns.com/data/global/pdfs/cr2010.pdf; ComponentLink8URL: https://www.bourns.com/docs/Product-Datasheets/CR2010.pdf; ComponentLink8Description: https://www.bourns.com/docs/Product-Datasheets/CR2010.pdf; .SCHCHK: USED; Supplier 1: Digi-Key; Supplier Part Number 1: RMCF2512ZT0R00DKR-ND
footprint R-2512
pins: 1, 2

## R-1K2-0603
designator R?, comment 1K2  Case Code (Imperial): 0603
RES SMD 1.2K OHM 1% 1/10W 0603; Manufacturer: Rohm; Manufacturer Part Number: KTR03EZPF1201; Resistance: 1.2kR; Max Power Dissipation: 100mW; Temperature Coefficient: 100ppm/°C; Voltage Rating (DC): 75V; .PCBCHK: USED; .Creator: F:TALI; Washability: OK; Stock 1: 8347; Pricing 1: 1=0.16, 10=0.142, 100=0.0545, 1000=0.02396, 2500=0.02069 (USD); Case/Package: 0603; Case Code (Metric): 1608; Min Operating Temperature: -55°C; Max Operating Temperature: 155°C; Package Quantity: 5000; Packaging: Cut Tape; Tolerance: 1%; Composition: Thick Film; Number of Terminations: 2; Features: Automotive AEC-Q200; Length: 0.063inch; Height: 0.022inch; Width: 0.031inch; ComponentLink1URL: http://www.rohm.com/web/global/datasheet/KTR03EZPF/ktr-e; ComponentLink1Description: http://www.rohm.com/web/global/datasheet/KTR03EZPF/ktr-e; Stock 2: 594390; Pricing 2: 1=0.1, 10=0.065, 100=0.0264, 1000=0.01186, 2500=0.01029 (USD); Mount: Surface Mount; Number of Pins: 2; Contact Plating: Tin; Military Standard: Not; Power Rating: 100mW; Voltage Rating: 75V; Termination: SMD/SMT; Depth: 0.8mm; Lead Free: Lead Free; REACH SVHC: No SVHC; ComponentLink2URL: http://www.farnell.com/datasheets/1911175.pdf; ComponentLink2Description: http://www.farnell.com/datasheets/1911175.pdf; ComponentLink3URL: http://industrial.panasonic.com/www-data/pdf/AOA0000/AOA0000CE2.pdf; ComponentLink3Description: http://industrial.panasonic.com/www-data/pdf/AOA0000/AOA0000CE2.pdf; ComponentLink4URL: http://components.arrow.com/part/dataview/3984556S183052N1386; ComponentLink4Description: http://components.arrow.com/part/dataview/3984556S183052N1386; ComponentLink5URL: http://www.farnell.com/datasheets/1678782.pdf; ComponentLink5Description: http://www.farnell.com/datasheets/1678782.pdf; ComponentLink6URL: https://www.alliedelec.com/m/d/623f45ff1957d936ff56d46fd1c28cac.pdf; ComponentLink6Description: https://www.alliedelec.com/m/d/623f45ff1957d936ff56d46fd1c28cac.pdf; ComponentLink7URL: http://www.mouser.com/ds/2/315/AOA0000C283-1093288.pdf; ComponentLink7Description: http://www.mouser.com/ds/2/315/AOA0000C283-1093288.pdf; Stock 3: 4952; Pricing 3: 1=0.1, 10=0.016, 100=0.0064, 1000=0.00289, 2500=0.0025 (USD); Radiation Hardening: No; .SCHCHK: USED; Supplier 1: Digi-Key; Supplier Part Number 1: P1.20KHDKR-ND
footprint R-0603
pins: 1, 2

## R-1K4-1210
designator R?, comment 1K4  Case Code (Imperial): 1210
RES SMD 1.4K OHM 1/2W 1% 1210; Manufacturer: Panasonic; Manufacturer Part Number: ERJ-14NF1401U; Resistance: 1.4kR; Power Rating: 500mW; Voltage Rating: 200V; Temperature Coefficient: 100ppm/°C; .PCBCHK: USED; .Creator: F:TALI; Washability: OK; Stock 1: 0; Pricing 1: 1=0.26, 10=0.22, 100=0.0861, 1000=0.03602, 2500=0.03302 (USD); Mount: Surface Mount; Case/Package: 1210; Case Code (Metric): 3225; Contact Plating: Tin; Min Operating Temperature: -55°C; Max Operating Temperature: 155°C; Packaging: Tape and Reel; Tolerance: 1%; Package Quantity: 1; Composition: Thick Film; Number of Terminations: 2; Termination: SMD/SMT; Military Standard: Not; Max Power Dissipation: 500mW; Voltage Rating (DC): 200V; Features: Automotive AEC-Q200; Length: 3.2mm; Height: 0.028inch; Width: 0.098inch; Depth: 2.5mm; Lead Free: Lead Free; ComponentLink1URL: http://industrial.panasonic.com/www-data/pdf/AOA0000/AOA0000CE2.pdf; ComponentLink1Description: http://industrial.panasonic.com/www-data/pdf/AOA0000/AOA0000CE2.pdf; ComponentLink2URL: http://www.mouser.com/ds/2/315/AOA0000CE2-37512.pdf; ComponentLink2Description: http://www.mouser.com/ds/2/315/AOA0000CE2-37512.pdf; Stock 2: 1947; Pricing 2: 1=0.27, 10=0.226, 100=0.0885, 1000=0.03703, 2500=0.03394 (USD); Number of Pins: 2; Radiation Hardening: No; REACH SVHC: Unknown; ComponentLink3URL: http://www.vishay.com/docs/20035/dcrcwe3.pdf; ComponentLink3Description: http://www.vishay.com/docs/20035/dcrcwe3.pdf; Stock 3: 9051; Pricing 3: 1=0.54, 10=0.387, 100=0.1548, 1000=0.07628, 2500=0.07067 (USD); ComponentLink4URL: http://industrial.panasonic.com/www-data/pdf/AOA0000/AOA0000CE4.pdf; ComponentLink4Description: http://industrial.panasonic.com/www-data/pdf/AOA0000/AOA0000CE4.pdf; ComponentLink5URL: http://www.farnell.com/datasheets/1801181.pdf; ComponentLink5Description: http://www.farnell.com/datasheets/1801181.pdf; ComponentLink6URL: http://www.farnell.com/datasheets/2059624.pdf; ComponentLink6Description: http://www.farnell.com/datasheets/2059624.pdf; ComponentLink7URL: http://www.mouser.com/ds/2/315/AOA0000C291-1101061.pdf; ComponentLink7Description: http://www.mouser.com/ds/2/315/AOA0000C291-1101061.pdf; .SCHCHK: USED; Supplier 1: Digi-Key; Supplier Part Number 1: P1.40KAADKR-ND
footprint R-1210
pins: 1, 2

## R-1K5-0603
designator R?, comment 1K5  Case Code (Imperial): 0603
RES SMD 1.5K OHM 1% 1/10W 0603; Manufacturer: Yageo; Manufacturer Part Number: RC0603FR-071K5L; Power Rating: 100mW; Voltage Rating: 50V; Resistance: 1.5kR; Temperature Coefficient: 100ppm/°C; .PCBCHK: USED; .Creator: F:TALI; Washability: OK; Supplier 1: Digi-Key; Supplier Part Number 1: 311-1.50KHRDKR-ND; Stock 1: 1539655; Pricing 1: 1=0.1, 10=0.026, 100=0.0107, 1000=0.00478, 2500=0.00415 (USD); Case/Package: 0603; Number of Pins: 2; Case Code (Metric): 1608; Min Operating Temperature: -55°C; Max Operating Temperature: 155°C; Tolerance: 1%; Packaging: Tape and Reel; Composition: Thick Film; Termination: SMD/SMT; Military Standard: Not; Package Quantity: 1; Number of Terminations: 2; Max Power Dissipation: 100mW; Features: Moisture Resistant; Voltage Rating (DC): 50V; Length: 0.063inch; Height: 0.022inch; Depth: 0.8mm; Width: 0.031inch; REACH SVHC: No SVHC; Lead Free: Lead Free; ComponentLink1URL: http://www.yageo.com/documents/recent/PYu-RC_Group_51_RoHS_L_9.pdf; ComponentLink1Description: http://www.yageo.com/documents/recent/PYu-RC_Group_51_RoHS_L_9.pdf; ComponentLink2URL: http://www.farnell.com/datasheets/1868787.pdf; ComponentLink2Description: http://www.farnell.com/datasheets/1868787.pdf; .SCHCHK: USED
footprint R-0603
pins: 1, 2

## R-1K5-1206
designator R?, comment 1K5  Case/Package: 1206  Max Power Dissipation: 1/2W
RES SMD 1.5K OHM 1% 1/2W 1206; Manufacturer: Stackpole Electronics; Manufacturer Part Number: RNCP1206FTD1K50; Resistance: 1.5kR; Temperature Coefficient: 100ppm/°C; .PCBCHK: USED; .Creator: F:TALI; Washability: OK; Supplier 1: Digi-Key; Supplier Part Number 1: RNCP1206FTD1K50DKR-ND; Stock 1: 64365; Pricing 1: 1=0.1, 10=0.093, 100=0.0358, 1000=0.01575, 2500=0.0136 (USD); Mount: Surface Mount; Case Code (Metric): 3216; Case Code (Imperial): 1206; Min Operating Temperature: -55°C; Max Operating Temperature: 155°C; Packaging: Tape and Reel; Composition: Thin Film; Number of Terminations: 2; Tolerance: 1%; Features: Anti-Sulfur,Moisture Resistant; Length: 0.122inch; Height: 0.024inch; Width: 0.059inch; Lead Free: Lead Free; .SCHCHK: USED
footprint R-1206
pins: 1, 2

## R-1K8-0603
designator R?, comment 1K8  Case/Package: 0603